# Altium footprint library 集大电协1.5.PcbLib: 227 footprints (part 6 of 18)
Each footprint in its own frame and in the unit in brackets; x right, y up, seen from the top. Pads: shape width x height; smd on the part's side, far side on the other; paste and mask are expansions set on the pad; w line width, h text height; cw(c..) or ccw(c..) is an arc to the next point about the centre after c.
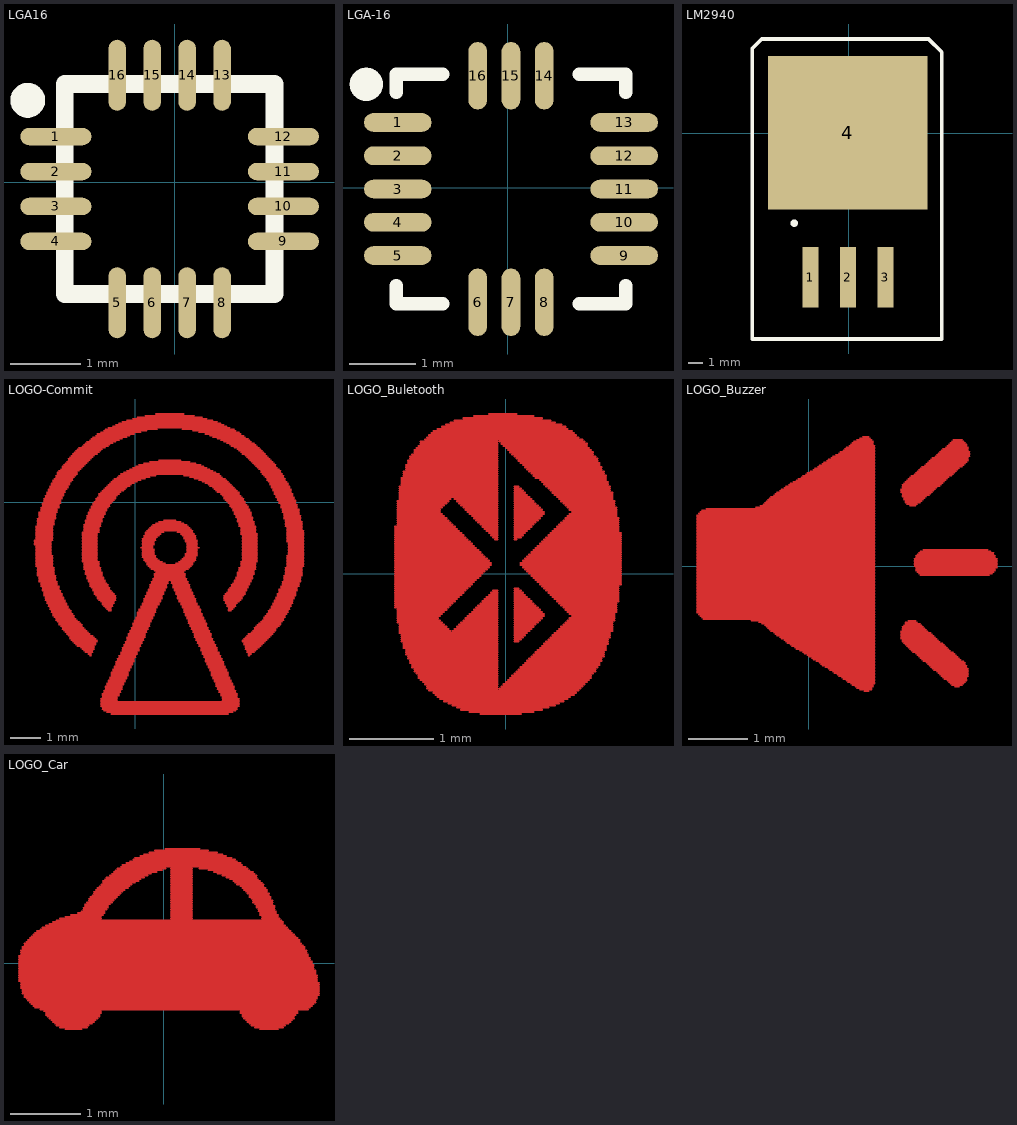
[diagram p5: the footprints below, top view; thin cyan lines are the x and y axes]

## LGA16 [mm]
pads (16):
  oval 1.016x0.25 smd: 1(-1.701,0.652) 2(-1.701,0.152) 3(-1.701,-0.348) 4(-1.701,-0.848) 9(1.553,-0.848) 10(1.553,-0.348) 11(1.553,0.152) 12(1.553,0.652)
  oval 0.25x1.016 smd: 5(-0.825,-1.726) 6(-0.325,-1.726) 7(0.175,-1.726) 8(0.675,-1.726) 13(0.675,1.528) 14(0.175,1.528) 15(-0.325,1.528) 16(-0.825,1.528)
Top Overlay:
  lines w0.25: -1.98,1.169 cw(c-2.105,1.17) -1.98,1.172
  lines w0.254: -1.574,-1.599 -1.574,1.401 1.426,1.401 1.426,-1.599 -1.574,-1.599

## LGA-16 [mil]
pads (16):
  oval 40x11.02 smd: 1(-65.02,38.76) 2(-65.02,19.07) 3(-65.02,-0.61) 4(-65.02,-20.3) 5(-65.02,-39.98) 9(69.02,-39.98) 10(69.02,-20.3) 11(69.02,-0.61) 12(69.02,19.07) 13(69.02,38.76)
  oval 11.02x40 smd: 6(-17.68,-67.63) 7(2,-67.63) 8(21.69,-67.63) 14(21.69,66.41) 15(2,66.41) 16(-17.68,66.41)
Top Overlay:
  lines w7.87: -65.91,-57.7 -65.91,-68.53 -38.35,-68.53 ; -65.91,56.47 -65.91,67.3 -38.35,67.3 ; 42.35,-68.53 69.91,-68.53 69.91,-57.7 ; 42.35,67.3 69.91,67.3 69.91,56.47
  lines w9.84: -78.7,61.29 cw(c-83.62,61.34) -78.7,61.39

## LM2940 [mm]
pads (4):
  rect 1.1x4.1 smd: 1(-2.591,-9.732) 2(-0.051,-9.732) 3(2.489,-9.732)
  rect 10.8x10.41 smd: 4(-0.051,0.047)
Top Overlay:
  circle w0.25: c-3.691,-6.076 r0.125
  lines w0.254: -6.528,-13.923 6.299,-13.923 6.299,5.508 5.41,6.397 -5.893,6.397 -6.528,5.762 -6.528,-13.923
3D body: height 5, standoff 0, extent -6.2,-5.2 6,6.2

## LOGO-Commit [mm]
Top Layer:
  lines w0.051: -3.327,-1.397 -2.769,-1.397 ; -3.327,-1.346 -2.769,-1.346 ; -3.327,-1.295 -2.769,-1.295 ; -3.327,-1.245 -2.718,-1.245 ; -3.277,-2.108 -2.718,-2.108 ; -3.277,-2.057 -2.718,-2.057 ; -3.277,-2.007 -2.718,-2.007 ; -3.277,-1.956 -2.718,-1.956 ; -3.277,-1.905 -2.718,-1.905 ; -3.277,-1.854 -2.718,-1.854 ; -3.277,-1.803 -2.718,-1.803 ; -3.277,-1.753 -2.718,-1.753 ; -3.277,-1.702 -2.769,-1.702 ; -3.277,-1.651 -2.769,-1.651 ; -3.277,-1.6 -2.769,-1.6 ; -3.277,-1.549 -2.769,-1.549 ; -3.277,-1.499 -2.769,-1.499 ; -3.277,-1.448 -2.769,-1.448 ; -3.277,-1.194 -2.718,-1.194 ; -3.277,-1.143 -2.718,-1.143 ; -3.277,-1.092 -2.718,-1.092 ; -3.277,-1.041 -2.718,-1.041 ; -3.277,-0.991 -2.718,-0.991 ; -3.277,-0.94 -2.718,-0.94 ; -3.277,-0.889 -2.718,-0.889 ; -3.277,-0.838 -2.718,-0.838 ; -3.277,-0.787 -2.718,-0.787 ; -3.226,-2.413 -2.616,-2.413 ; -3.226,-2.362 -2.667,-2.362 ; -3.226,-2.311 -2.667,-2.311 ; -3.226,-2.261 -2.667,-2.261 ; -3.226,-2.21 -2.667,-2.21 ; -3.226,-2.159 -2.667,-2.159 ; -3.226,-0.737 -2.667,-0.737 ; -3.226,-0.686 -2.667,-0.686 ; -3.226,-0.635 -2.667,-0.635 ; -3.226,-0.584 -2.667,-0.584 ; -3.226,-0.533 -2.616,-0.533 ; -3.175,-2.616 -2.565,-2.616 ; -3.175,-2.565 -2.616,-2.565 ; -3.175,-2.515 -2.616,-2.515 ; -3.175,-2.464 -2.616,-2.464 ; -3.175,-0.483 -2.616,-0.483 ; -3.175,-0.432 -2.616,-0.432 ; -3.175,-0.381 -2.616,-0.381 ; -3.175,-0.33 -2.565,-0.33 ; -3.124,-2.769 -2.515,-2.769 ; -3.124,-2.718 -2.565,-2.718 ; -3.124,-2.667 -2.565,-2.667 ; -3.124,-0.279 -2.565,-0.279 ; -3.124,-0.229 -2.565,-0.229 ; -3.124,-0.178 -2.515,-0.178 ; -3.073,-2.921 -2.464,-2.921 ; -3.073,-2.87 -2.515,-2.87 ; -3.073,-2.819 -2.515,-2.819 ; -3.073,-0.127 -2.515,-0.127 ; -3.073,-0.076 -2.515,-0.076 ; -3.073,-0.025 -2.464,-0.025 ; -3.023,-3.073 -2.413,-3.073 ; -3.023,-3.023 -2.413,-3.023 ; -3.023,-2.972 -2.464,-2.972 ; -3.023,0.025 -2.464,0.025 ; -3.023,0.076 -2.464,0.076 ; -3.023,0.127 -2.413,0.127 ; -2.972,-3.226 -2.311,-3.226 ; -2.972,-3.175 -2.362,-3.175 ; -2.972,-3.124 -2.362,-3.124 ; -2.972,0.178 -2.413,0.178 ; -2.972,0.229 -2.362,0.229 ; -2.921,-3.327 -2.261,-3.327 ; -2.921,-3.277 -2.311,-3.277 ; -2.921,0.279 -2.362,0.279 ; -2.921,0.33 -2.311,0.33 ; -2.87,-3.429 -2.21,-3.429 ; -2.87,-3.378 -2.261,-3.378 ; -2.87,0.381 -2.311,0.381 ; -2.87,0.432 -2.261,0.432 ; -2.819,-3.531 -2.159,-3.531 ; -2.819,-3.48 -2.21,-3.48 ; -2.819,0.483 -2.21,0.483 ; -2.819,0.533 -2.21,0.533 ; -2.769,-3.632 -2.108,-3.632 ; -2.769,-3.581 -2.108,-3.581 ; -2.769,0.584 -2.159,0.584 ; -2.769,0.635 -2.159,0.635 ; -2.718,-3.734 -2.007,-3.734 ; -2.718,-3.683 -2.057,-3.683 ; -2.718,0.686 -2.108,0.686 ; -2.718,0.737 -2.057,0.737 ; -2.667,-3.785 -2.007,-3.785 ; -2.667,0.787 -2.057,0.787 ; -2.616,-3.886 -1.905,-3.886 ; -2.616,-3.835 -1.956,-3.835 ; -2.616,0.838 -2.007,0.838 ; -2.616,0.889 -1.956,0.889 ; -2.565,-3.937 -1.854,-3.937 ; -2.565,0.94 -1.905,0.94 ; -2.565,0.991 -1.905,0.991 ; -2.515,-4.039 -1.753,-4.039 ; -2.515,-3.988 -1.803,-3.988 ; -2.515,1.041 -1.854,1.041 ; -2.464,-4.089 -1.753,-4.089 ; -2.464,1.092 -1.803,1.092 ; -2.413,-4.191 -1.651,-4.191 ; -2.413,-4.14 -1.702,-4.14 ; -2.413,1.143 -1.753,1.143 ; -2.413,1.194 -1.702,1.194 ; -2.362,-4.242 -1.6,-4.242 ; -2.362,1.245 -1.651,1.245 ; -2.311,-4.293 -1.549,-4.293 ; -2.311,1.295 -1.6,1.295 ; -2.261,-4.343 -1.499,-4.343 ; -2.261,1.346 -1.549,1.346 ; -2.21,-4.394 -1.397,-4.394 ; -2.21,1.397 -1.499,1.397 ; -2.21,1.448 -1.448,1.448 ; -2.159,-4.496 -1.295,-4.496 ; -2.159,-4.445 -1.346,-4.445 ; -2.159,1.499 -1.397,1.499 ; -2.108,-4.547 -1.245,-4.547 ; -2.108,1.549 -1.346,1.549 ; -2.057,-4.597 -1.245,-4.597 ; -2.057,1.6 -1.245,1.6 ; -2.007,-4.648 -1.295,-4.648 ; -2.007,1.651 -1.194,1.651 ; -1.956,-4.699 -1.295,-4.699 ; -1.956,1.702 -1.143,1.702 ; -1.905,-4.75 -1.346,-4.75 ; -1.905,1.753 -1.092,1.753 ; -1.854,1.803 -0.991,1.803 ; -1.803,-4.801 -1.346,-4.801 ; -1.753,-4.851 -1.346,-4.851 ; -1.753,-1.956 -1.194,-1.956 ; -1.753,-1.905 -1.245,-1.905 ; -1.753,-1.854 -1.245,-1.854 ; -1.753,-1.803 -1.245,-1.803 ; -1.753,-1.753 -1.245,-1.753 ; -1.753,-1.702 -1.245,-1.702 ; -1.753,-1.651 -1.245,-1.651 ; -1.753,-1.6 -1.245,-1.6 ; -1.753,-1.549 -1.245,-1.549 ; -1.753,-1.499 -1.245,-1.499 ; -1.753,-1.448 -1.245,-1.448 ; -1.753,-1.397 -1.245,-1.397 ; -1.753,-1.346 -1.245,-1.346 ; -1.753,-1.295 -1.245,-1.295 ; -1.753,-1.245 -1.245,-1.245 ; -1.753,-1.194 -1.245,-1.194 ; -1.753,-1.143 -1.245,-1.143 ; -1.753,-1.092 -1.245,-1.092 ; -1.753,-1.041 -1.245,-1.041 ; -1.753,-0.991 -1.194,-0.991 ; -1.753,1.854 -0.889,1.854 ; -1.702,-4.902 -1.397,-4.902 ; -1.702,-2.21 -1.143,-2.21 ; -1.702,-2.159 -1.143,-2.159 ; -1.702,-2.108 -1.194,-2.108 ; -1.702,-2.057 -1.194,-2.057 ; -1.702,-2.007 -1.194,-2.007 ; -1.702,-0.94 -1.194,-0.94 ; -1.702,-0.889 -1.194,-0.889 ; -1.702,-0.838 -1.194,-0.838 ; -1.702,-0.787 -1.143,-0.787 ; -1.702,-0.737 -1.143,-0.737 ; -1.702,1.905 -0.838,1.905 ; -1.651,-4.953 -1.397,-4.953 ; -1.651,-2.362 -1.092,-2.362 ; -1.651,-2.311 -1.092,-2.311 ; -1.651,-2.261 -1.143,-2.261 ; -1.651,-0.686 -1.143,-0.686 ; -1.651,-0.635 -1.092,-0.635 ; -1.651,-0.584 -1.092,-0.584 ; -1.651,1.956 -0.737,1.956 ; -1.6,-2.515 -1.041,-2.515 ; -1.6,-2.464 -1.041,-2.464 ; -1.6,-2.413 -1.092,-2.413 ; -1.6,-0.533 -1.092,-0.533 ; -1.6,-0.483 -1.041,-0.483 ; -1.6,-0.432 -1.041,-0.432 ; -1.6,2.007 -0.635,2.007 ; -1.549,-5.004 -1.448,-5.004 ; -1.549,-2.616 -0.991,-2.616 ; -1.549,-2.565 -0.991,-2.565 ; -1.549,-0.381 -0.991,-0.381 ; -1.549,-0.33 -0.991,-0.33 ; -1.499,-5.055 -1.448,-5.055 ; -1.499,-2.769 -0.889,-2.769 ; -1.499,-2.718 -0.889,-2.718 ; -1.499,-2.667 -0.94,-2.667 ; -1.499,-0.279 -0.94,-0.279 ; -1.499,-0.229 -0.94,-0.229 ; -1.499,2.057 -0.533,2.057 ; -1.448,-2.819 -0.838,-2.819 ; -1.448,-0.178 -0.889,-0.178 ; -1.448,-0.127 -0.838,-0.127 ; -1.448,2.108 -0.432,2.108 ; -1.397,-2.921 -0.787,-2.921 ; -1.397,-2.87 -0.838,-2.87 ; -1.397,-0.076 -0.838,-0.076 ; -1.397,-0.025 -0.787,-0.025 ; -1.397,2.159 -0.279,2.159 ; -1.346,-3.023 -0.686,-3.023 ; -1.346,-2.972 -0.737,-2.972 ; -1.346,0.025 -0.737,0.025 ; -1.295,-3.073 -0.635,-3.073 ; -1.295,0.076 -0.686,0.076 ; -1.295,0.127 -0.635,0.127 ; -1.295,2.21 -0.178,2.21 ; -1.245,-3.175 -0.635,-3.175 ; -1.245,-3.124 -0.635,-3.124 ; -1.245,0.178 -0.635,0.178 ; -1.245,2.261 -0.025,2.261 ; -1.194,-3.226 -0.635,-3.226 ; -1.194,0.229 -0.584,0.229 ; -1.194,0.279 -0.533,0.279 ; -1.143,-6.731 3.429,-6.731 ; -1.143,-6.68 3.429,-6.68 ; -1.143,-6.629 3.429,-6.629 ; -1.143,-6.579 3.429,-6.579 ; -1.143,-6.528 -0.584,-6.528 ; -1.143,-6.477 -0.584,-6.477 ; -1.143,-3.277 -0.686,-3.277 ; -1.143,0.33 -0.483,0.33 ; -1.143,2.311 0.178,2.311 ; -1.092,-6.833 3.378,-6.833 ; -1.092,-6.782 3.378,-6.782 ; -1.092,-6.426 -0.584,-6.426 ; -1.092,-6.375 -0.533,-6.375 ; -1.092,-6.325 -0.533,-6.325 ; -1.092,-3.378 -0.737,-3.378 ; -1.092,-3.327 -0.686,-3.327 ; -1.092,0.381 -0.381,0.381 ; -1.041,-6.883 3.327,-6.883 ; -1.041,-6.274 -0.483,-6.274 ; -1.041,-6.223 -0.483,-6.223 ; -1.041,-3.429 -0.737,-3.429 ; -1.041,0.432 -0.33,0.432 ; -1.041,2.362 0.381,2.362 ; -0.991,-6.172 -0.432,-6.172 ; -0.991,-6.121 -0.432,-6.121 ; -0.991,-6.071 -0.432,-6.071 ; -0.991,-3.48 -0.787,-3.48 ; -0.991,0.483 -0.279,0.483 ; -0.991,2.413 0.737,2.413 ; -0.94,-6.934 3.226,-6.934 ; -0.94,-6.02 -0.381,-6.02 ; -0.94,-5.969 -0.381,-5.969 ; -0.94,-3.531 -0.787,-3.531 ; -0.94,0.533 -0.178,0.533 ; -0.889,-5.918 -0.33,-5.918 ; -0.889,-5.867 -0.33,-5.867 ; -0.889,-3.581 -0.787,-3.581 ; -0.889,0.584 -0.127,0.584 ; -0.889,2.464 3.124,2.464 ; -0.838,-5.817 -0.279,-5.817 ; -0.838,-5.766 -0.279,-5.766 ; -0.838,0.635 -0.025,0.635 ; -0.787,-6.985 3.073,-6.985 ; -0.787,-5.715 -0.229,-5.715 ; -0.787,-5.664 -0.229,-5.664 ; -0.787,-5.613 -0.229,-5.613 ; -0.787,0.686 0.076,0.686 ; -0.737,-5.563 -0.178,-5.563 ; -0.737,-5.512 -0.178,-5.512 ; -0.737,0.737 0.178,0.737 ; -0.737,2.515 3.023,2.515 ; -0.686,-5.461 -0.127,-5.461 ; -0.686,-5.41 -0.127,-5.41 ; -0.686,0.787 0.33,0.787 ; -0.635,-5.359 -0.076,-5.359 ; -0.635,-5.309 -0.076,-5.309 ; -0.635,-5.258 -0.025,-5.258 ; -0.635,2.565 2.921,2.565 ; -0.584,-5.207 -0.025,-5.207 ; -0.584,-5.156 -0.025,-5.156 ; -0.584,0.838 0.483,0.838 ; -0.533,-5.105 0.025,-5.105 ; -0.533,-5.055 0.025,-5.055 ; -0.533,0.889 0.686,0.889 ; -0.533,2.616 2.819,2.616 ; -0.483,-5.004 0.076,-5.004 ; -0.483,-4.953 0.076,-4.953 ; -0.483,0.94 2.769,0.94 ; -0.432,-4.902 0.127,-4.902 ; -0.432,-4.851 0.127,-4.851 ; -0.432,-4.801 0.127,-4.801 ; -0.432,2.667 2.718,2.667 ; -0.381,-4.75 0.178,-4.75 ; -0.381,-4.699 0.178,-4.699 ; -0.381,0.991 2.667,0.991 ; -0.33,-4.648 0.229,-4.648 ; -0.33,-4.597 0.229,-4.597 ; -0.279,-4.547 0.279,-4.547 ; -0.279,-4.496 0.279,-4.496 ; -0.279,-4.445 0.33,-4.445 ; -0.279,1.041 2.565,1.041 ; -0.279,2.718 2.565,2.718 ; -0.229,-4.394 0.33,-4.394 ; -0.229,-4.343 0.33,-4.343 ; -0.178,-4.293 0.381,-4.293 ; -0.178,-4.242 0.381,-4.242 ; -0.178,1.092 2.464,1.092 ; -0.127,-4.191 0.432,-4.191 ; -0.127,-4.14 0.432,-4.14 ; -0.076,-4.089 0.483,-4.089 ; -0.076,-4.039 0.483,-4.039 ; -0.076,-3.988 0.483,-3.988 ; -0.076,1.143 2.362,1.143 ; -0.076,2.769 2.362,2.769 ; -0.025,-3.937 0.533,-3.937 ; -0.025,-3.886 0.533,-3.886 ; 0.025,-3.835 0.584,-3.835 ; 0.025,-3.785 0.584,-3.785 ; 0.025,1.194 2.261,1.194 ; 0.076,-3.734 0.635,-3.734 ; 0.076,-3.683 0.635,-3.683 ; 0.076,-3.632 0.686,-3.632 ; 0.076,2.819 2.21,2.819 ; 0.127,-3.581 0.686,-3.581 ; 0.127,-3.531 0.686,-3.531 ; 0.127,1.245 2.159,1.245 ; 0.178,-3.48 0.737,-3.48 ; 0.178,-3.429 0.737,-3.429 ; 0.178,-1.499 0.584,-1.499 ; 0.229,-3.378 0.787,-3.378 ; 0.229,-3.327 0.787,-3.327 ; 0.229,-1.803 0.686,-1.803 ; 0.229,-1.753 0.686,-1.753 ; 0.229,-1.702 0.635,-1.702 ; 0.229,-1.651 0.635,-1.651 ; 0.229,-1.6 0.635,-1.6 ; 0.229,-1.549 0.635,-1.549 ; 0.229,-1.448 0.584,-1.448 ; 0.229,-1.397 0.635,-1.397 ; 0.229,-1.346 0.635,-1.346 ; 0.229,-1.295 0.635,-1.295 ; 0.229,-1.245 0.686,-1.245 ; 0.229,-1.194 0.686,-1.194 ; 0.279,-3.277 0.838,-3.277 ; 0.279,-3.226 0.838,-3.226 ; 0.279,-3.175 0.889,-3.175 ; 0.279,-1.905 0.787,-1.905 ; 0.279,-1.854 0.737,-1.854 ; 0.279,-1.143 0.737,-1.143 ; 0.279,-1.092 0.787,-1.092 ; 0.279,1.295 2.007,1.295 ; 0.33,-3.124 0.889,-3.124 ; 0.33,-3.073 0.889,-3.073 ; 0.33,-1.956 0.889,-1.956 ; 0.33,-1.041 0.838,-1.041 ; 0.33,-0.991 0.94,-0.991 ; 0.33,2.87 1.956,2.87 ; 0.381,-3.023 0.94,-3.023 ; 0.381,-2.972 0.94,-2.972 ; 0.381,-2.057 1.905,-2.057 ; 0.381,-2.007 0.991,-2.007 ; 0.381,-0.94 1.905,-0.94 ; 0.432,-2.921 0.991,-2.921 ; 0.432,-2.87 0.991,-2.87 ; 0.432,-2.108 1.854,-2.108 ; 0.432,-0.889 1.854,-0.889 ; 0.483,-2.819 1.041,-2.819 ; 0.483,-2.769 1.041,-2.769 ; 0.483,-2.718 1.041,-2.718 ; 0.483,-2.159 1.803,-2.159 ; 0.483,-0.838 1.803,-0.838 ; 0.483,1.346 1.803,1.346 ; 0.533,-2.667 1.092,-2.667 ; 0.533,-2.616 1.092,-2.616 ; 0.533,-2.21 1.753,-2.21 ; 0.533,-0.787 1.753,-0.787 ; 0.584,-2.565 1.702,-2.565 ; 0.584,-2.515 1.702,-2.515 ; 0.584,-0.737 1.702,-0.737 ; 0.635,-2.464 1.651,-2.464 ; 0.635,-2.413 1.651,-2.413 ; 0.635,-2.362 1.651,-2.362 ; 0.635,-2.261 1.651,-2.261 ; 0.686,-2.311 1.6,-2.311 ; 0.686,-0.686 1.6,-0.686 ; 0.686,2.921 1.6,2.921 ; 0.787,-0.635 1.499,-0.635 ; 0.787,1.397 1.499,1.397 ; 0.94,-0.584 1.346,-0.584 ; 1.194,-2.667 1.753,-2.667 ; 1.194,-2.616 1.753,-2.616 ; 1.245,-2.819 1.803,-2.819 ; 1.245,-2.769 1.803,-2.769 ; 1.245,-2.718 1.803,-2.718 ; 1.295,-2.921 1.854,-2.921 ; 1.295,-2.87 1.854,-2.87 ; 1.346,-3.023 1.905,-3.023 ; 1.346,-2.972 1.905,-2.972 ; 1.346,-2.007 1.905,-2.007 ; 1.397,-3.175 2.007,-3.175 ; 1.397,-3.124 1.956,-3.124 ; 1.397,-3.073 1.956,-3.073 ; 1.397,-0.991 1.905,-0.991 ; 1.448,-3.277 2.007,-3.277 ; 1.448,-3.226 2.007,-3.226 ; 1.448,-1.956 1.956,-1.956 ; 1.499,-3.378 2.057,-3.378 ; 1.499,-3.327 2.057,-3.327 ; 1.499,-1.905 2.007,-1.905 ; 1.499,-1.041 1.956,-1.041 ; 1.549,-3.48 2.108,-3.48 ; 1.549,-3.429 2.108,-3.429 ; 1.549,-1.854 2.007,-1.854 ; 1.549,-1.092 2.007,-1.092 ; 1.549,2.413 3.277,2.413 ; 1.6,-3.632 2.159,-3.632 ; 1.6,-3.581 2.159,-3.581 ; 1.6,-3.531 2.159,-3.531 ; 1.6,-1.803 2.007,-1.803 ; 1.6,-1.194 2.007,-1.194 ; 1.6,-1.143 2.007,-1.143 ; 1.6,0.889 2.819,0.889 ; 1.651,-3.734 2.21,-3.734 ; 1.651,-3.683 2.21,-3.683 ; 1.651,-1.753 2.057,-1.753 ; 1.651,-1.702 2.057,-1.702 ; 1.651,-1.295 2.057,-1.295 ; 1.651,-1.245 2.057,-1.245 ; 1.702,-3.835 2.261,-3.835 ; 1.702,-3.785 2.261,-3.785 ; 1.702,-1.651 2.057,-1.651 ; 1.702,-1.6 2.057,-1.6 ; 1.702,-1.549 2.057,-1.549 ; 1.702,-1.499 2.108,-1.499 ; 1.702,-1.448 2.057,-1.448 ; 1.702,-1.397 2.057,-1.397 ; 1.702,-1.346 2.057,-1.346 ; 1.753,-3.988 2.362,-3.988 ; 1.753,-3.937 2.311,-3.937 ; 1.753,-3.886 2.311,-3.886 ; 1.803,-4.089 2.362,-4.089 ; 1.803,-4.039 2.362,-4.039 ; 1.803,0.838 2.87,0.838 ; 1.854,-4.191 2.413,-4.191 ; 1.854,-4.14 2.413,-4.14 ; 1.905,-4.293 2.464,-4.293 ; 1.905,-4.242 2.464,-4.242 ; 1.905,2.362 3.327,2.362 ; 1.956,-4.445 2.515,-4.445 ; 1.956,-4.394 2.515,-4.394 ; 1.956,-4.343 2.515,-4.343 ; 1.956,0.787 2.972,0.787 ; 2.007,-4.547 2.565,-4.547 ; 2.007,-4.496 2.565,-4.496 ; 2.057,-4.648 2.616,-4.648 ; 2.057,-4.597 2.616,-4.597 ; 2.108,-4.75 2.667,-4.75 ; 2.108,-4.699 2.667,-4.699 ; 2.108,0.737 3.023,0.737 ; 2.108,2.311 3.429,2.311 ; 2.159,-4.902 2.718,-4.902 ; 2.159,-4.851 2.718,-4.851 ; 2.159,-4.801 2.718,-4.801 ; 2.21,-5.004 2.769,-5.004 ; 2.21,-4.953 2.769,-4.953 ; 2.21,0.686 3.073,0.686 ; 2.261,-5.105 2.819,-5.105 ; 2.261,-5.055 2.819,-5.055 ; 2.311,-5.258 2.921,-5.258 ; 2.311,-5.207 2.87,-5.207 ; 2.311,-5.156 2.87,-5.156 ; 2.311,0.635 3.124,0.635 ; 2.311,2.261 3.48,2.261 ; 2.362,-5.359 2.921,-5.359 ; 2.362,-5.309 2.921,-5.309 ; 2.413,-5.461 2.972,-5.461 ; 2.413,-5.41 2.972,-5.41 ; 2.413,0.584 3.175,0.584 ; 2.464,-5.563 3.023,-5.563 ; 2.464,-5.512 3.023,-5.512 ; 2.464,0.533 3.226,0.533 ; 2.464,2.21 3.581,2.21 ; 2.515,-5.715 3.073,-5.715 ; 2.515,-5.664 3.073,-5.664 ; 2.515,-5.613 3.073,-5.613 ; 2.565,-5.817 3.124,-5.817 ; 2.565,-5.766 3.124,-5.766 ; 2.565,0.483 3.277,0.483 ; 2.565,2.159 3.632,2.159 ; 2.616,-5.918 3.175,-5.918 ; 2.616,-5.867 3.175,-5.867 ; 2.616,0.432 3.327,0.432 ; 2.667,-6.071 3.277,-6.071 ; 2.667,-6.02 3.226,-6.02 ; 2.667,-5.969 3.226,-5.969 ; 2.667,0.381 3.378,0.381 ; 2.718,-6.172 3.277,-6.172 ; 2.718,-6.121 3.277,-6.121 ; 2.718,0.33 3.429,0.33 ; 2.718,2.108 3.734,2.108 ; 2.769,-6.274 3.327,-6.274 ; 2.769,-6.223 3.327,-6.223 ; 2.819,-6.375 3.378,-6.375 ; 2.819,-6.325 3.378,-6.325 ; 2.819,0.279 3.429,0.279 ; 2.819,2.057 3.785,2.057 ; 2.87,-6.528 3.429,-6.528 ; 2.87,-6.477 3.429,-6.477 ; 2.87,-6.426 3.378,-6.426 ; 2.87,0.229 3.48,0.229 ; 2.921,-3.226 3.48,-3.226 ; 2.921,-3.175 3.531,-3.175 ; 2.921,-3.124 3.531,-3.124 ; 2.921,-3.073 3.581,-3.073 ; 2.921,0.127 3.581,0.127 ; 2.921,0.178 3.531,0.178 ; 2.921,2.007 3.835,2.007 ; 2.972,-3.327 3.378,-3.327 ; 2.972,-3.277 3.429,-3.277 ; 2.972,-3.023 3.632,-3.023 ; 2.972,0.076 3.581,0.076 ; 3.023,-3.429 3.327,-3.429 ; 3.023,-3.378 3.327,-3.378 ; 3.023,-2.972 3.632,-2.972 ; 3.023,0.025 3.632,0.025 ; 3.023,1.956 3.937,1.956 ; 3.073,-3.581 3.175,-3.581 ; 3.073,-3.531 3.226,-3.531 ; 3.073,-3.48 3.277,-3.48 ; 3.073,-2.921 3.683,-2.921 ; 3.073,-2.87 3.683,-2.87 ; 3.073,-0.025 3.632,-0.025 ; 3.124,-2.819 3.734,-2.819 ; 3.124,-0.127 3.734,-0.127 ; 3.124,-0.076 3.683,-0.076 ; 3.124,1.905 3.988,1.905 ; 3.175,-2.769 3.734,-2.769 ; 3.175,-2.718 3.785,-2.718 ; 3.175,-0.178 3.734,-0.178 ; 3.175,1.854 4.039,1.854 ; 3.226,-2.667 3.785,-2.667 ; 3.226,-0.279 3.785,-0.279 ; 3.226,-0.229 3.785,-0.229 ; 3.277,-2.616 3.835,-2.616 ; 3.277,-2.565 3.835,-2.565 ; 3.277,-0.381 3.835,-0.381 ; 3.277,-0.33 3.835,-0.33 ; 3.277,1.803 4.089,1.803 ; 3.327,-2.515 3.886,-2.515 ; 3.327,-2.464 3.886,-2.464 ; 3.327,-0.483 3.886,-0.483 ; 3.327,-0.432 3.835,-0.432 ; 3.378,-2.413 3.886,-2.413 ; 3.378,-2.362 3.937,-2.362 ; 3.378,-2.311 3.937,-2.311 ; 3.378,-0.635 3.937,-0.635 ; 3.378,-0.584 3.886,-0.584 ; 3.378,-0.533 3.886,-0.533 ; 3.378,1.753 4.14,1.753 ; 3.429,-2.261 3.937,-2.261 ; 3.429,-2.21 3.988,-2.21 ; 3.429,-2.159 3.988,-2.159 ; 3.429,-0.787 3.988,-0.787 ; 3.429,-0.737 3.937,-0.737 ; 3.429,-0.686 3.937,-0.686 ; 3.429,1.702 4.191,1.702 ; 3.48,-2.108 3.988,-2.108 ; 3.48,-2.057 3.988,-2.057 ; 3.48,-2.007 3.988,-2.007 ; 3.48,-1.956 4.039,-1.956 ; 3.48,-1.041 4.039,-1.041 ; 3.48,-0.991 3.988,-0.991 ; 3.48,-0.94 3.988,-0.94 ; 3.48,-0.889 3.988,-0.889 ; 3.48,-0.838 3.988,-0.838 ; 3.48,1.651 4.242,1.651 ; 3.531,-4.597 4.293,-4.597 ; 3.531,-4.547 4.343,-4.547 ; 3.531,-1.905 4.039,-1.905 ; 3.531,-1.854 4.039,-1.854 ; 3.531,-1.803 4.039,-1.803 ; 3.531,-1.753 4.039,-1.753 ; 3.531,-1.702 4.039,-1.702 ; 3.531,-1.651 4.039,-1.651 ; 3.531,-1.6 4.039,-1.6 ; 3.531,-1.549 4.039,-1.549 ; 3.531,-1.499 4.039,-1.499 ; 3.531,-1.448 4.039,-1.448 ; 3.531,-1.397 4.039,-1.397 ; 3.531,-1.346 4.039,-1.346 ; 3.531,-1.295 4.039,-1.295 ; 3.531,-1.245 4.039,-1.245 ; 3.531,-1.194 4.039,-1.194 ; 3.531,-1.143 4.039,-1.143 ; 3.531,-1.092 4.039,-1.092 ; 3.531,1.6 4.293,1.6 ; 3.581,-4.699 4.191,-4.699 ; 3.581,-4.648 4.242,-4.648 ; 3.581,-4.496 4.394,-4.496 ; 3.632,-4.851 4.039,-4.851 ; 3.632,-4.801 4.089,-4.801 ; 3.632,-4.75 4.14,-4.75 ; 3.632,-4.445 4.445,-4.445 ; 3.632,1.549 4.343,1.549 ; 3.683,-4.953 3.937,-4.953 ; 3.683,-4.902 3.988,-4.902 ; 3.683,-4.394 4.496,-4.394 ; 3.683,1.499 4.394,1.499 ; 3.734,-5.055 3.785,-5.055 ; 3.734,-5.004 3.835,-5.004 ; 3.734,-4.343 4.547,-4.343 ; 3.734,1.448 4.445,1.448 ; 3.785,1.397 4.496,1.397 ; 3.835,-4.293 4.597,-4.293 ; 3.835,1.346 4.547,1.346 ; 3.886,-4.242 4.648,-4.242 ; 3.886,1.295 4.597,1.295 ; 3.937,-4.191 4.648,-4.191 ; 3.937,-4.14 4.699,-4.14 ; 3.937,1.245 4.648,1.245 ; 3.988,-4.089 4.75,-4.089 ; 3.988,1.194 4.648,1.194 ; 4.039,-4.039 4.801,-4.039 ; 4.039,1.143 4.699,1.143 ; 4.089,-3.988 4.801,-3.988 ; 4.089,1.092 4.75,1.092 ; 4.14,-3.937 4.851,-3.937 ; 4.14,0.991 4.801,0.991 ; 4.14,1.041 4.801,1.041 ; 4.191,-3.886 4.902,-3.886 ; 4.191,0.94 4.851,0.94 ; 4.242,-3.835 4.902,-3.835 ; 4.242,-3.785 4.953,-3.785 ; 4.242,0.889 4.902,0.889 ; 4.293,-3.734 4.953,-3.734 ; 4.293,0.838 4.902,0.838 ; 4.343,-3.683 5.004,-3.683 ; 4.343,0.737 4.953,0.737 ; 4.343,0.787 4.953,0.787 ; 4.394,-3.632 5.055,-3.632 ; 4.394,-3.581 5.055,-3.581 ; 4.394,0.686 5.004,0.686 ; 4.445,-3.531 5.105,-3.531 ; 4.445,0.584 5.055,0.584 ; 4.445,0.635 5.055,0.635 ; 4.496,-3.48 5.105,-3.48 ; 4.496,-3.429 5.156,-3.429 ; 4.496,0.483 5.105,0.483 ; 4.496,0.533 5.105,0.533 ; 4.547,-3.378 5.156,-3.378 ; 4.547,-3.327 5.207,-3.327 ; 4.547,0.381 5.156,0.381 ; 4.547,0.432 5.156,0.432 ; 4.597,-3.277 5.207,-3.277 ; 4.597,-3.226 5.207,-3.226 ; 4.597,0.279 5.207,0.279 ; 4.597,0.33 5.156,0.33 ; 4.648,-3.175 5.258,-3.175 ; 4.648,-3.124 5.258,-3.124 ; 4.648,0.178 5.258,0.178 ; 4.648,0.229 5.207,0.229 ; 4.699,-3.073 5.309,-3.073 ; 4.699,-3.023 5.309,-3.023 ; 4.699,0.076 5.309,0.076 ; 4.699,0.127 5.258,0.127 ; 4.75,-2.972 5.309,-2.972 ; 4.75,-2.921 5.359,-2.921 ; 4.75,-2.87 5.359,-2.87 ; 4.75,-0.025 5.309,-0.025 ; 4.75,0.025 5.309,0.025 ; 4.801,-2.819 5.359,-2.819 ; 4.801,-2.769 5.41,-2.769 ; 4.801,-0.178 5.359,-0.178 ; 4.801,-0.127 5.359,-0.127 ; 4.801,-0.076 5.359,-0.076 ; 4.851,-2.718 5.41,-2.718 ; 4.851,-2.667 5.41,-2.667 ; 4.851,-2.616 5.461,-2.616 ; 4.851,-0.33 5.41,-0.33 ; 4.851,-0.279 5.41,-0.279 ; 4.851,-0.229 5.41,-0.229 ; 4.902,-2.565 5.461,-2.565 ; 4.902,-2.515 5.461,-2.515 ; 4.902,-2.464 5.461,-2.464 ; 4.902,-2.413 5.512,-2.413 ; 4.902,-0.533 5.461,-0.533 ; 4.902,-0.483 5.461,-0.483 ; 4.902,-0.432 5.461,-0.432 ; 4.902,-0.381 5.41,-0.381 ; 4.953,-2.362 5.512,-2.362 ; 4.953,-2.311 5.512,-2.311 ; 4.953,-2.261 5.512,-2.261 ; 4.953,-2.21 5.512,-2.21 ; 4.953,-2.159 5.512,-2.159 ; 4.953,-0.787 5.512,-0.787 ; 4.953,-0.737 5.512,-0.737 ; 4.953,-0.686 5.512,-0.686 ; 4.953,-0.635 5.512,-0.635 ; 4.953,-0.584 5.461,-0.584 ; 5.004,-2.108 5.563,-2.108 ; 5.004,-2.057 5.563,-2.057 ; 5.004,-2.007 5.563,-2.007 ; 5.004,-1.956 5.563,-1.956 ; 5.004,-1.905 5.563,-1.905 ; 5.004,-1.854 5.563,-1.854 ; 5.004,-1.803 5.563,-1.803 ; 5.004,-1.753 5.563,-1.753 ; 5.004,-1.295 5.563,-1.295 ; 5.004,-1.245 5.563,-1.245 ; 5.004,-1.194 5.563,-1.194 ; 5.004,-1.143 5.563,-1.143 ; 5.004,-1.092 5.563,-1.092 ; 5.004,-1.041 5.563,-1.041 ; 5.004,-0.991 5.563,-0.991 ; 5.004,-0.94 5.563,-0.94 ; 5.004,-0.889 5.512,-0.889 ; 5.004,-0.838 5.512,-0.838 ; 5.055,-1.702 5.563,-1.702 ; 5.055,-1.651 